# Altium footprint library TranDangKhoa-LIB.PcbLib: 1435 footprints (part 72 of 90)
Each footprint in its own frame and in the unit in brackets; x right, y up, seen from the top. Pads: shape width x height; smd on the part's side, far side on the other; paste and mask are expansions set on the pad; w line width, h text height; cw(c..) or ccw(c..) is an arc to the next point about the centre after c.
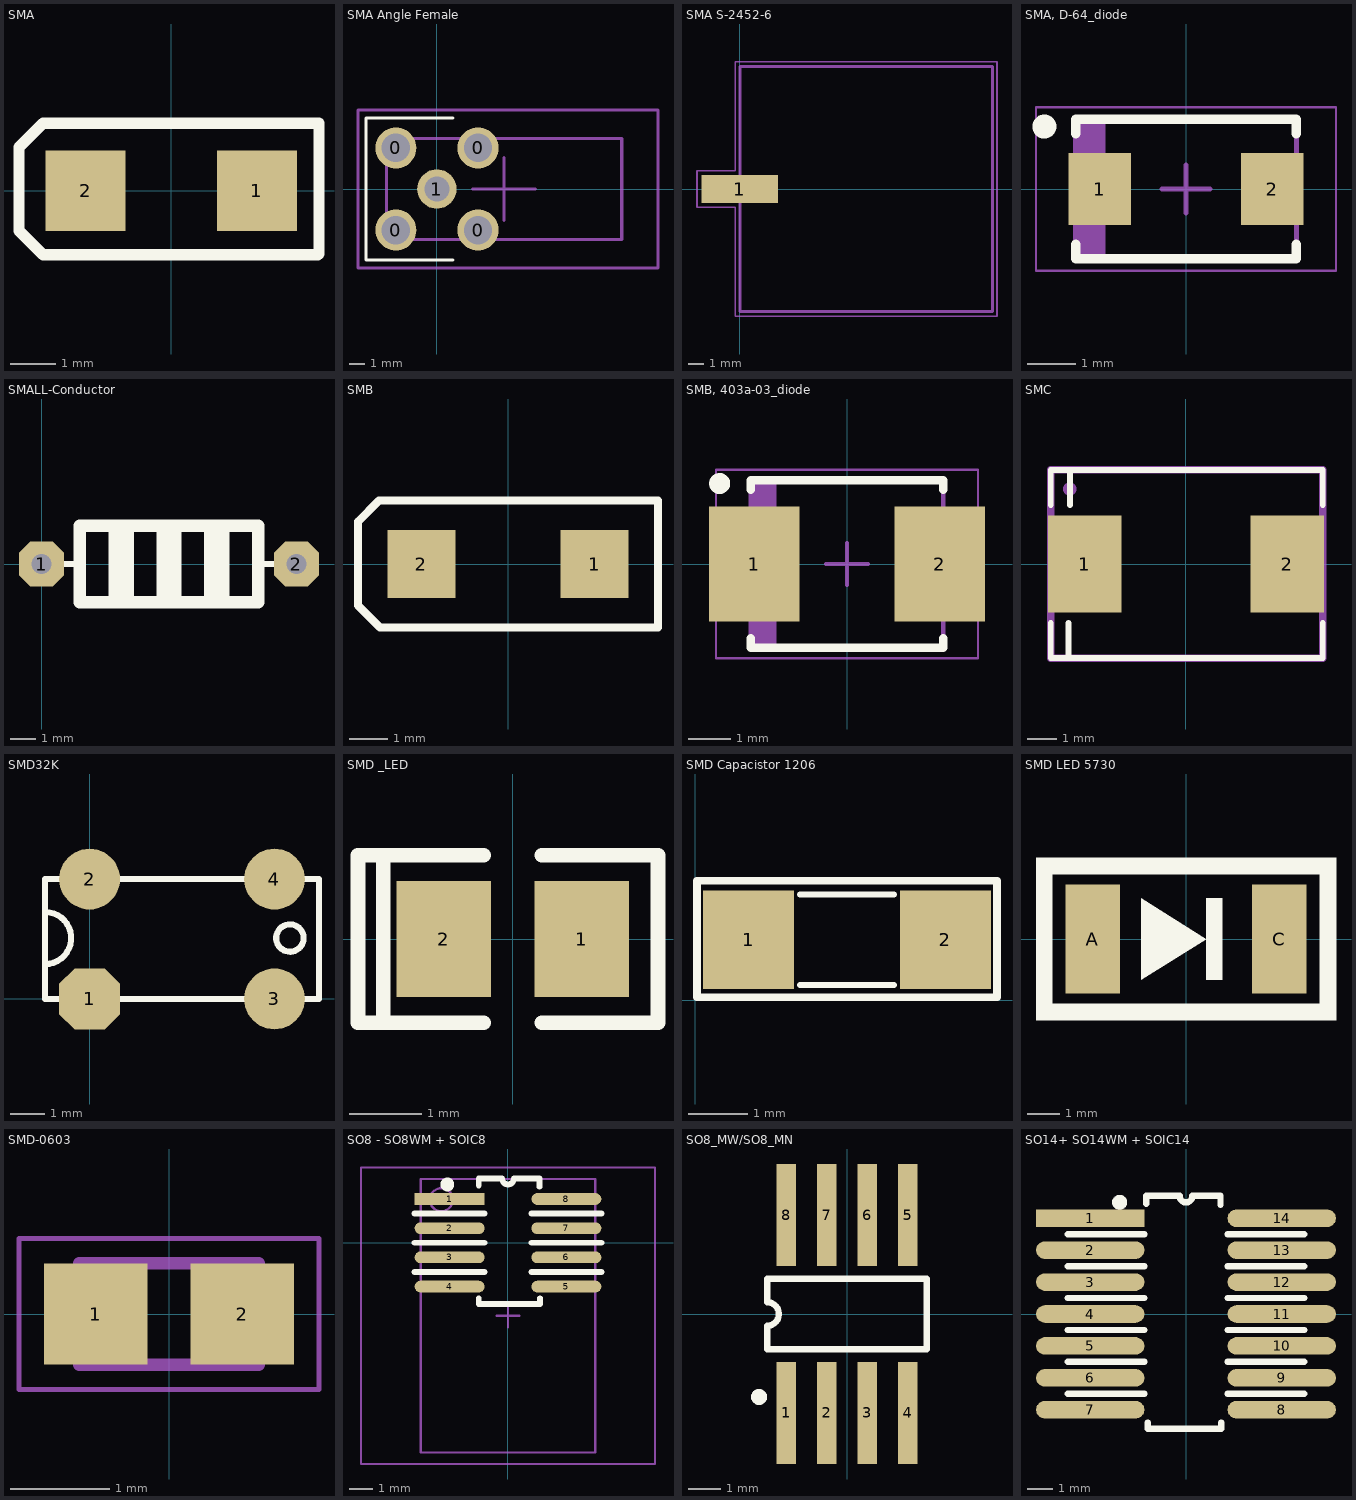
[diagram p71: the footprints below, top view; thin cyan lines are the x and y axes]

## SMA [mil]
pads (2):
  rect 70x70 smd: 1(74.8,0) 2(-74.8,0)
Top Overlay:
  lines w10: -133,-35 -112,-56 -111,-56 128,-56 129,-55 129,59 -106,59 -112,59 -133,38 -133,-35

## SMA Angle Female [mm]
pads (5):
  round 2.6 hole 1.8 mask+0.01: 0(-2.6,-2.6) 0(-2.6,2.6) 0(2.6,-2.6) 0(2.6,2.6)
  round 2.5 hole 1.6 mask+0.01: 1(0,0)
Top Overlay:
  lines w0.2: 1,-4.5 -4.5,-4.5 -4.5,4.5 1,4.5
Mechanical 13:
  lines w0.2: -3.2,-3.2 11.7,-3.2 11.7,3.2 -3.2,3.2 -3.2,-3.2
Mechanical 15:
  lines w0.2: 2.25,0 4.25,0 ; 4.25,-2 4.25,0 ; 4.25,2 4.25,0 ; 6.25,0 4.25,0 ; -5,-5 -5,5 14,5 14,-5 -5,-5
3D body "SMA Angle Female.STEP": height 9.8, standoff -3, extent -3.2,-3.2 11.7,3.2

## SMA S-2452-6 [mm]
pads (1):
  rect 5x1.8 smd mask+0.01: 1(0,0)
Mechanical 13:
  lines w0.2: 0,-8 0,8 16.5,8 16.5,-8 0,-8
Mechanical 15:
  lines w0.1: -2.8,-1.2 -0.3,-1.2 -0.3,-8.3 16.8,-8.3 16.8,8.3 -0.3,8.3 -0.3,1.2 -2.8,1.2 -2.8,-1.2
3D body "SMA S-2452-6.STEP": height 3.89, standoff -2.61, extent 0,-8 16.5,8

## SMA, D-64_diode [mm] "Molded Diode, 2-Leads, Body 4.60x2.90mm, IPC Medium Density"
height 2.44
pads (2):
  rect 1.3x1.5 smd: 1(-1.8,0) 2(1.8,0)
Top Overlay:
  circle w0.25: c-2.95,1.3 r0.125
  lines w0.2: -2.3,-1.15 -2.3,-1.45 2.3,-1.45 2.3,-1.15 ; -2.3,1.15 -2.3,1.45 2.3,1.45 2.3,1.15
Mechanical 13:
  rectangle: -2.3,-1.45 -1.681,1.45
  lines w0.1: -2.3,-1.45 2.3,-1.45 2.3,1.45 -2.3,1.45 -2.3,-1.45
Mechanical 15:
  lines w0.05: -3.125,-1.7 3.125,-1.7 3.125,1.7 -3.125,1.7 -3.125,-1.7
  lines w0.1: -0.5,0 0.5,0 ; 0,-0.5 0,0.5
3D body: height 2.44, standoff 0, extent -2.3,-1.45 2.3,1.45

## SMALL-Conductor [mm] "Small value conductor"
pads (2):
  oct 1.8x1.8 hole 0.8: 1(0,0) 2(10.16,0)
Top Overlay:
  rectangle: 6.477,-1.524 7.493,1.524
  rectangle: 2.667,-1.524 3.683,1.524
  rectangle: 4.572,-1.524 5.588,1.524
  lines w0.254: 0,0 1.524,0 ; 8.89,0 10.16,0
  lines w0.5: 1.524,-1.524 1.524,1.524 8.636,1.524 8.636,-1.524 1.524,-1.524

## SMB [mil]
pads (2):
  rect 70x70 smd: 1(88.58,0) 2(-88.58,0)
Top Overlay:
  lines w7.87: -153.54,-42.46 -153.54,0 -153.54,43.46 -132.04,64.96 153.54,64.96 153.54,-64.96 -131.04,-64.96 -153.54,-42.46

## SMB, 403a-03_diode [mm] "Molded Diode, 2-Leads, Body 4.60x3.95mm, IPC Medium Density"
height 2.45
pads (2):
  rect 2.159x2.743 smd: 1(-2.21,0) 2(2.21,0)
Top Overlay:
  circle w0.25: c-3.04,1.921 r0.125
  lines w0.2: -2.3,-1.772 -2.3,-2 2.3,-2 2.3,-1.772 ; -2.3,1.772 -2.3,2 2.3,2 2.3,1.772
Mechanical 13:
  rectangle: -2.3,-1.975 -1.681,1.975
  lines w0.1: -2.3,-1.975 2.3,-1.975 2.3,1.975 -2.3,1.975 -2.3,-1.975
Mechanical 15:
  lines w0.05: -3.125,-2.25 3.125,-2.25 3.125,2.25 -3.125,2.25 -3.125,-2.25
  lines w0.1: -0.5,0 0.5,0 ; 0,-0.5 0,0.5
3D body: height 2.45, standoff 0, extent -2.3,-1.975 2.3,1.975

## SMC [mm]
pads (2):
  rect 2.5x3.3 smd: 1(-3.45,0) 2(3.45,0)
Top Overlay:
  lines w0.2: -4.6,-2 -4.6,-3.2 4.65,-3.2 4.65,-2 ; -4.6,2 -4.6,3.2 4.65,3.2 4.65,2 ; -4,-3.2 -4,-2 ; -3.95,2 -3.95,3.2
Mechanical 16:
  circle w0.254: c-3.95,2.55 r0.1
  lines w0.254: -4.6,-3.2 4.65,-3.2 4.65,3.2 -4.6,3.2 -4.6,-3.2
Mechanical 29:
  text ".Designator" at -1.9,-0.7 h1.52
3D body "DO-214AB SMC.step": height 2.3, standoff 0, extent -3.975,-2.95 3.975,2.95

## SMD32K [mil]
pads (4):
  oct 70x70 smd: 1(0,0)
  round 70 smd: 2(0,137.8) 3(212.6,0) 4(212.6,137.8)
Top Overlay:
  circle w7: c230.31,70 r15.75
  lines w7: -51.18,40 ccw(c-51.18,70) -51.18,100 ; -27.56,0 -51.18,0 -51.18,137.8 -27.56,137.8 ; 27.56,0 185.04,0 ; 27.56,137.8 185.04,137.8 ; 240.16,0 263.78,0 263.78,137.8 240.16,137.8

## SMD _LED [mm]
pads (2):
  rect 1.3x1.6 smd: 1(0.95,0) 2(-0.95,0)
Top Overlay:
  lines w0.2: -1.78,-1.15 -1.78,1.15 ; -0.4,-1.15 -2.13,-1.15 -2.13,1.15 -0.4,1.15 ; 0.4,-1.15 2,-1.15 2,1.15 0.4,1.15

## SMD Capacistor 1206 [mil]
pads (2):
  rect 60x65 smd: 1(35,40) 2(165,40)
Top Overlay:
  lines w4: 69,10 131,10 ; 69,70 131,70
  lines w5: 1,2 199,2 199,79 1,79 1,2
3D body "SW3dPS-smt_resistor_packages.STEP": height 24.02, standoff -0.39, extent 60.24,15 139.76,65

## SMD LED 5730 [mm]
pads (2):
  rect 1.7x3.4 smd paste+0 mask+0.051: A(-2.921,0) C(2.921,0)
Top Overlay:
  region: -1.397,1.27 -1.397,-1.27 0.635,0
  region: 0.635,0 0.635,1.27 1.143,1.27 1.143,-1.27 0.635,-1.27
  region: -4.699,-2.54 -4.699,-2.032 4.191,-2.032 4.191,2.032 -4.699,2.032 -4.699,2.54 4.699,2.54 4.699,-2.54
  region: -4.699,-2.54 -4.699,2.54 -4.191,2.286 -4.191,-2.54

## SMD-0603 [mm]
pads (2):
  rect 1.04x1.02 smd: 1(-0.735,0) 2(0.735,0)
Mechanical 13:
  lines w0.127: -0.9,-0.51 -0.9,0.51 0.9,0.51 0.9,-0.51 -0.9,-0.51
Mechanical 15:
  lines w0.05: -1.508,-0.761 -1.508,0.761 1.508,0.761 1.508,-0.761 -1.508,-0.761
3D body "step_temp.STEP": height 0.55, standoff 0, extent -0.8,-0.4 0.8,0.4

## SO8 - SO8WM + SOIC8 [mil] "SO, 14-Leads, Body 10x3.8mm, Pitch 1.27mm"
height 104.33
pads (8):
  rect 120x20 smd: 1(-100,75)
  oval 120x20 smd: 2(-100,25) 3(-100,-25) 4(-100,-75) 5(100,-75) 6(100,-25) 7(100,25) 8(100,75)
Top Overlay:
  circle w15.75: c-103.94,100 r3.94
  lines w10: -160,-50 -40,-50 ; -160,0 -40,0 ; -160,50 -40,50 ; -50,-95 -50,-105 55,-105 55,-95 ; -50,98 -50,110 -10,110 ccw(c0,110) 10,110 54,110 54,106.5 54,99.5 54,96 ; 40,-50 160,-50 ; 40,0 160,0 ; 40,50 160,50
Mechanical 13:
  circle w3.94: c-114.17,73.82 r19.68
  lines w3.94: -149.61,-359.25 149.61,-359.25 149.61,109.25 -149.61,109.25 -149.61,-359.25
Mechanical 15:
  lines w3.94: -19.68,-125 19.69,-125 ; 0,-144.69 0,-105.31 ; -251.97,-378.94 251.97,-378.94 251.97,128.94 -251.97,128.94 -251.97,-378.94

## SO8_MW/SO8_MN [mm] "S08 Wide / S08 Narrow dual footprint 8 lead Plastic Small Outline"
height 1.78
pads (8):
  rect 0.6x3.2 smd: 1(-1.905,-3.1) 2(-0.635,-3.1) 3(0.635,-3.1) 4(1.905,-3.1) 5(1.905,3.1) 6(0.635,3.1) 7(-0.635,3.1) 8(-1.905,3.1)
Top Overlay:
  circle w0.25: c-2.755,-2.6 r0.125
  lines w0.2: -2.5,-1.1 2.5,-1.1 2.5,1.1 -2.5,1.1 -2.5,0.367 cw(c-2.5,0) -2.5,-0.367 -2.5,-1.1

## SO14+ SO14WM + SOIC14 [mm] "SO, 14-Leads, Body 10x3.8mm, Pitch 1.27mm"
height 2.65
pads (14):
  rect 4.318x0.7 smd: 1(-3.81,3.81)
  oval 4.318x0.7 smd: 2(-3.81,2.54) 3(-3.81,1.27) 4(-3.81,0) 5(-3.81,-1.27) 6(-3.81,-2.54) 7(-3.81,-3.81) 8(3.81,-3.81) 9(3.81,-2.54) 10(3.81,-1.27) 11(3.81,0) 12(3.81,1.27) 13(3.81,2.54) 14(3.81,3.81)
Top Overlay:
  circle w0.4: c-2.64,4.445 r0.1
  lines w0.254: -4.699,-3.175 -1.651,-3.175 ; -4.699,-1.905 -1.651,-1.905 ; -4.699,-0.635 -1.651,-0.635 ; -4.699,0.635 -1.651,0.635 ; -4.699,1.905 -1.651,1.905 ; -4.699,3.175 -1.651,3.175 ; -1.575,4.394 -1.575,4.699 -0.254,4.699 ccw(c0,4.699) 0.254,4.699 1.372,4.699 1.372,4.61 1.372,4.432 1.372,4.343 ; -1.524,-4.318 -1.524,-4.572 1.397,-4.572 1.397,-4.318 ; 1.651,-3.175 4.699,-3.175 ; 1.651,-1.905 4.699,-1.905 ; 1.651,-0.635 4.699,-0.635 ; 1.651,0.635 4.699,0.635 ; 1.651,1.905 4.699,1.905 ; 1.651,3.175 4.699,3.175